# Altium footprint library 3.22-杂项.PcbLib: 985 footprints (part 53 of 64)
Each footprint in its own frame and in the unit in brackets; x right, y up, seen from the top. Pads: shape width x height; smd on the part's side, far side on the other; paste and mask are expansions set on the pad; w line width, h text height; cw(c..) or ccw(c..) is an arc to the next point about the centre after c.
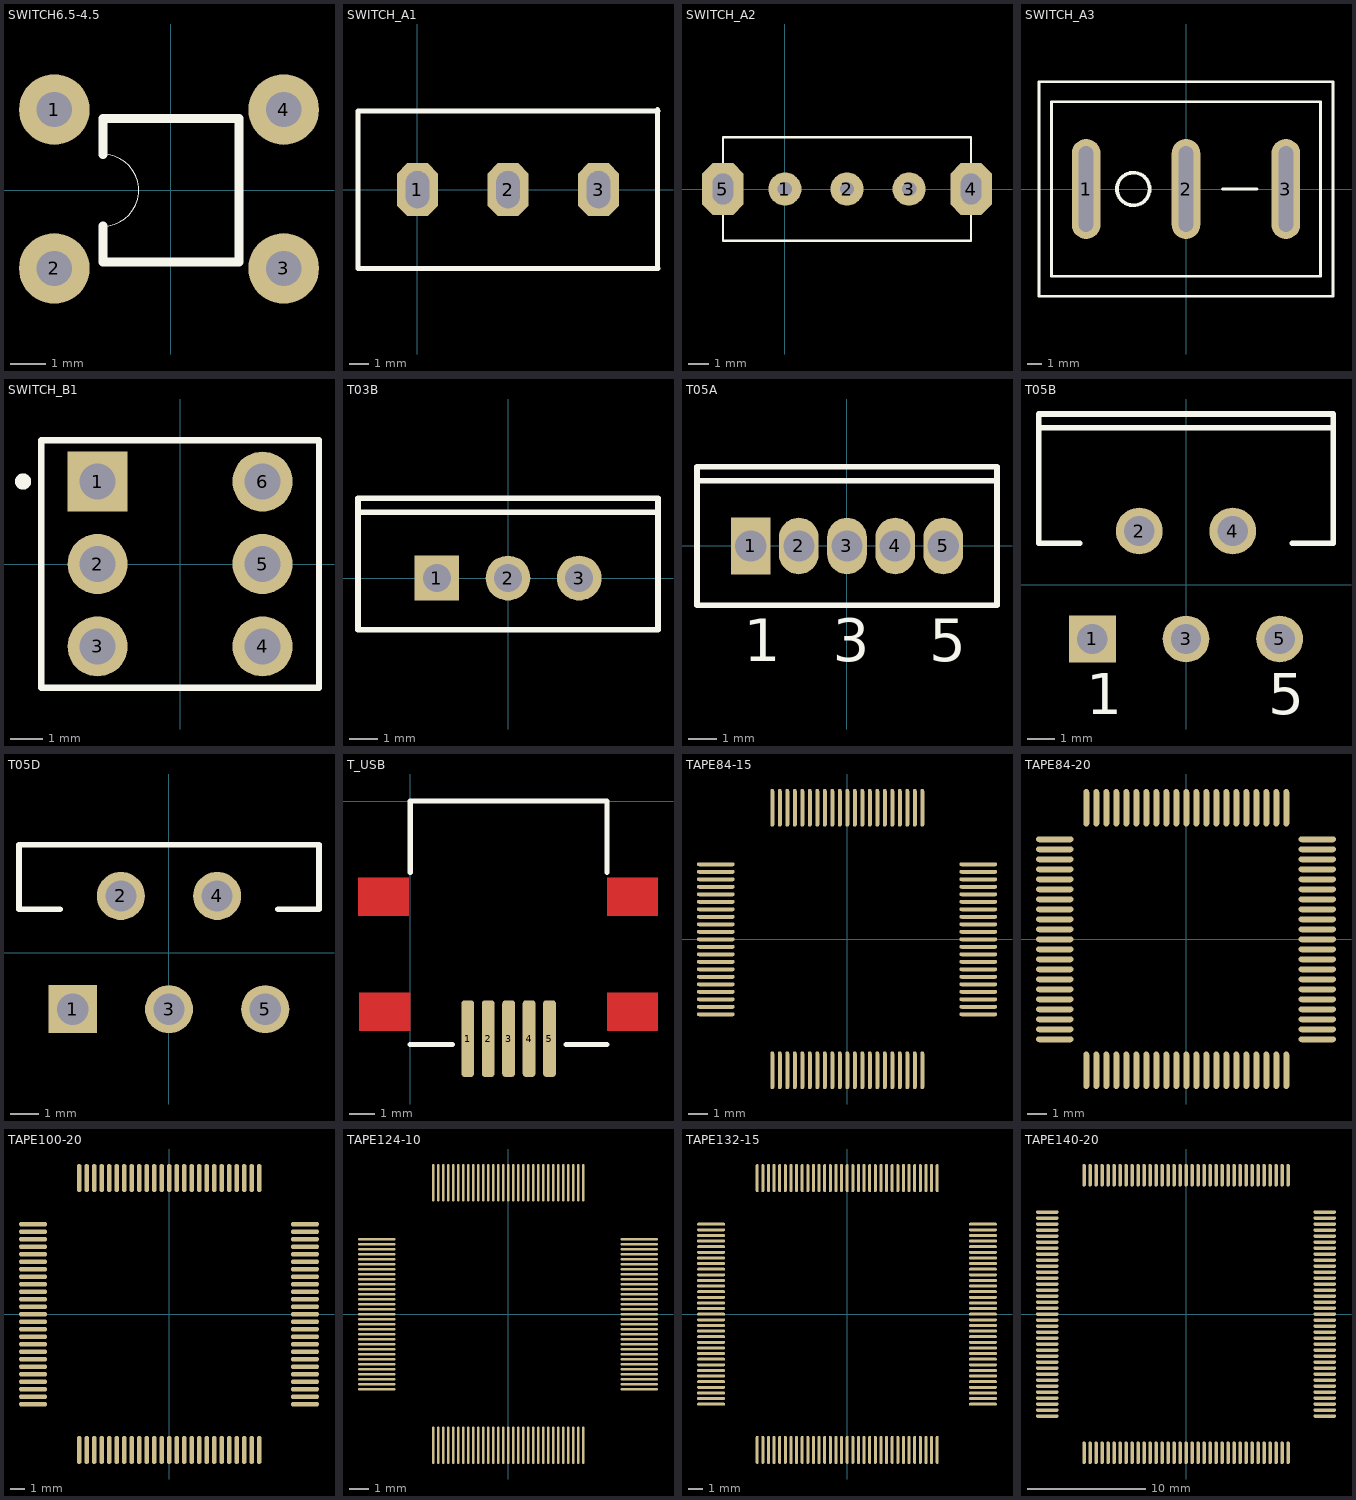
[diagram p52: the footprints below, top view; thin cyan lines are the x and y axes]

## SWITCH6.5-4.5 [mm] "6.5mm*4.5mm"
pads (4):
  round 2 hole 1: 1(-3.302,2.286) 2(-3.302,-2.214) 3(3.198,-2.214) 4(3.198,2.286)
Top Overlay:
  lines w0.025: -1.928,-1.016 ccw(c-1.928,0) -1.928,1.016
  lines w0.254: -1.928,-1.016 -1.928,-2.032 1.928,-2.032 1.928,2.032 -1.928,2.032 -1.928,1.016

## SWITCH_A1 [mm] "扭子开关"
height 10
pads (3):
  oct 2.1x2.7 hole 1.2 slot 1.9 at 90 deg: 1(0,0) 2(4.6,0) 3(9.2,0)
Top Overlay:
  lines w0.254: 12.192,-3.972 12.192,4.064 ; 12.22,-4 -3.02,-4 -3.02,4 12.22,4

## SWITCH_A2 [mm] "平拨开关"
height 9
pads (5):
  round 1.6 hole 0.7: 1(0,0) 2(3,0) 3(6,0)
  oct 2x2.5 hole 1 slot 1.5 at 90 deg: 4(9,0) 5(-3,0)
Top Overlay:
  lines w0.1: -3,-2.5 9,-2.5 9,2.5 -3,2.5 -3,-2.5

## SWITCH_A3 [mm] "单刀单掷开关"
height 9
pads (3):
  oval 2x7 hole 1 slot 6 at 90 deg: 1(-6.985,0) 2(0,0) 3(6.985,0)
Top Overlay:
  circle w0.254: c-3.683,0 r1.143
  lines w0.2: 2.54,0 4.953,0 ; -10.287,-7.493 -10.287,7.493 10.287,7.493 10.287,-7.493 -10.287,-7.493 ; -9.398,-6.096 9.398,-6.096 9.398,6.096 -9.398,6.096 -9.398,-6.096

## SWITCH_B1 [mm] "单刀"
height 1.75
pads (6):
  rect 1.85x1.85 hole 1.1: 1(-2.54,2.54)
  round 1.85 hole 1.1: 2(-2.54,0) 3(-2.54,-2.54) 4(2.54,-2.54) 5(2.54,0) 6(2.54,2.54)
Top Overlay:
  circle w0.25: c-4.836,2.541 r0.125
  lines w0.2: -4.28,-3.81 -4.28,3.81 4.28,3.81 4.28,-3.81 -4.28,-3.81

## T03B [mm] "TO, Thru-Hole, Vertical, Heatsink Mounted; 3 In-Line Leads; Pitch 2.54 mm"
height 19.4
pads (3):
  rect 1.6x1.6 hole 1: 1(-2.54,0)
  round 1.6 hole 1: 2(0,0) 3(2.54,0)
Top Overlay:
  lines w0.2: -5.35,2.35 5.35,2.35 ; -5.35,-1.85 5.35,-1.85 5.35,2.85 -5.35,2.85 -5.35,-1.85

## T05A [mm] "TO, Thru-Hole, Vertical, Heatsink Mounted; 5 In-Line Leads; Pitch 1.70 mm"
height 15.9
pads (5):
  rect 1.4x2 hole 1.1: 1(-3.4,0)
  oval 1.4x2 hole 1.1: 2(-1.7,0) 3(0,0) 4(1.7,0) 5(3.4,0)
Top Overlay:
  lines w0.2: -5.3,2.3 5.3,2.3 ; -5.3,-2.1 5.3,-2.1 5.3,2.8 -5.3,2.8 -5.3,-2.1
  text "1" at -3.65,-4.075 h1.5
  text "3" at -0.5,-4.075 h1.5
  text "5" at 2.9,-4.075 h1.5

## T05B [mm] "TO, Thru-Hole, Vertical, Heatsink Mounted; 5 Bent Staggered Leads; Pitch 1.7 mm"
height 21.1
pads (5):
  rect 1.7x1.7 hole 1.1: 1(-3.4,-1.96)
  round 1.7 hole 1.1: 2(-1.7,1.96) 3(0,-1.96) 4(1.7,1.96) 5(3.4,-1.96)
Top Overlay:
  lines w0.2: -5.35,5.71 5.35,5.71 ; -3.854,1.51 -5.35,1.51 -5.35,6.21 5.35,6.21 5.35,1.51 3.854,1.51
  text "1" at -3.62,-4.685 h1.5
  text "5" at 2.98,-4.685 h1.5

## T05D [mm]
height 21.1
pads (5):
  rect 1.7x1.7 hole 1.1: 1(-3.4,-2)
  round 1.7 hole 1.1: 2(-1.7,2) 3(0,-2) 4(1.7,2) 5(3.4,-2)
Top Overlay:
  lines w0.2: -3.854,1.53 -5.3,1.53 -5.3,3.81 5.3,3.81 5.3,1.53 3.854,1.53

## T_USB [mm]
pads (5):
  rrect50% 0.5x3 smd: 1(2.25,-9.3) 2(3.05,-9.3) 3(3.85,-9.3) 4(4.65,-9.3) 5(5.45,-9.3)
Top Layer:
  rectangle: 7.7,-4.5 9.7,-3
  rectangle: 7.7,-9 9.7,-7.5
  rectangle: -2,-9 0,-7.5
  rectangle: -2.048,-4.5 -0.048,-3
Top Overlay:
  lines w0.2: 0,-9.525 1.651,-9.525 ; 0,-2.794 0,0 7.7,0 7.7,-2.794 ; 6.096,-9.525 7.7,-9.525

## TAPE84-15 [mil]
pads (84):
  oval 75x8 smd: 1(-262.5,149.5) 2(-262.5,134.5) 3(-262.5,119.5) 4(-262.5,104.5) 5(-262.5,89.5) 6(-262.5,74.5) 7(-262.5,59.5) 8(-262.5,44.5) 9(-262.5,29.5) 10(-262.5,14.5) 11(-262.5,-0.5) 12(-262.5,-15.5) 13(-262.5,-30.5) 14(-262.5,-45.5) 15(-262.5,-60.5) 16(-262.5,-75.5) 17(-262.5,-90.5) 18(-262.5,-105.5) 19(-262.5,-120.5) 20(-262.5,-135.5) 21(-262.5,-150.5) 43(262.5,-150.5) 44(262.5,-135.5) 45(262.5,-120.5) 46(262.5,-105.5) 47(262.5,-90.5) 48(262.5,-75.5) 49(262.5,-60.5) 50(262.5,-45.5) 51(262.5,-30.5) 52(262.5,-15.5) 53(262.5,-0.5) 54(262.5,14.5) 55(262.5,29.5) 56(262.5,44.5) 57(262.5,59.5) 58(262.5,74.5) 59(262.5,89.5) 60(262.5,104.5) 61(262.5,119.5) 62(262.5,134.5) 63(262.5,149.5)
  oval 8x75 smd: 22(-149.5,-262.5) 23(-134.5,-262.5) 24(-119.5,-262.5) 25(-104.5,-262.5) 26(-89.5,-262.5) 27(-74.5,-262.5) 28(-59.5,-262.5) 29(-44.5,-262.5) 30(-29.5,-262.5) 31(-14.5,-262.5) 32(0.5,-262.5) 33(15.5,-262.5) 34(30.5,-262.5) 35(45.5,-262.5) 36(60.5,-262.5) 37(75.5,-262.5) 38(90.5,-262.5) 39(105.5,-262.5) 40(120.5,-262.5) 41(135.5,-262.5) 42(150.5,-262.5) 64(150.5,262.5) 65(135.5,262.5) 66(120.5,262.5) 67(105.5,262.5) 68(90.5,262.5) 69(75.5,262.5) 70(60.5,262.5) 71(45.5,262.5) 72(30.5,262.5) 73(15.5,262.5) 74(0.5,262.5) 75(-14.5,262.5) 76(-29.5,262.5) 77(-44.5,262.5) 78(-59.5,262.5) 79(-74.5,262.5) 80(-89.5,262.5) 81(-104.5,262.5) 82(-119.5,262.5) 83(-134.5,262.5) 84(-149.5,262.5)

## TAPE84-20 [mil]
pads (84):
  oval 75x12 smd: 1(-262.5,199.5) 2(-262.5,179.5) 3(-262.5,159.5) 4(-262.5,139.5) 5(-262.5,119.5) 6(-262.5,99.5) 7(-262.5,79.5) 8(-262.5,59.5) 9(-262.5,39.5) 10(-262.5,19.5) 11(-262.5,-0.5) 12(-262.5,-20.5) 13(-262.5,-40.5) 14(-262.5,-60.5) 15(-262.5,-80.5) 16(-262.5,-100.5) 17(-262.5,-120.5) 18(-262.5,-140.5) 19(-262.5,-160.5) 20(-262.5,-180.5) 21(-262.5,-200.5) 43(262.5,-200.5) 44(262.5,-180.5) 45(262.5,-160.5) 46(262.5,-140.5) 47(262.5,-120.5) 48(262.5,-100.5) 49(262.5,-80.5) 50(262.5,-60.5) 51(262.5,-40.5) 52(262.5,-20.5) 53(262.5,-0.5) 54(262.5,19.5) 55(262.5,39.5) 56(262.5,59.5) 57(262.5,79.5) 58(262.5,99.5) 59(262.5,119.5) 60(262.5,139.5) 61(262.5,159.5) 62(262.5,179.5) 63(262.5,199.5)
  oval 12x75 smd: 22(-199.5,-262.5) 23(-179.5,-262.5) 24(-159.5,-262.5) 25(-139.5,-262.5) 26(-119.5,-262.5) 27(-99.5,-262.5) 28(-79.5,-262.5) 29(-59.5,-262.5) 30(-39.5,-262.5) 31(-19.5,-262.5) 32(0.5,-262.5) 33(20.5,-262.5) 34(40.5,-262.5) 35(60.5,-262.5) 36(80.5,-262.5) 37(100.5,-262.5) 38(120.5,-262.5) 39(140.5,-262.5) 40(160.5,-262.5) 41(180.5,-262.5) 42(200.5,-262.5) 64(200.5,262.5) 65(180.5,262.5) 66(160.5,262.5) 67(140.5,262.5) 68(120.5,262.5) 69(100.5,262.5) 70(80.5,262.5) 71(60.5,262.5) 72(40.5,262.5) 73(20.5,262.5) 74(0.5,262.5) 75(-19.5,262.5) 76(-39.5,262.5) 77(-59.5,262.5) 78(-79.5,262.5) 79(-99.5,262.5) 80(-119.5,262.5) 81(-139.5,262.5) 82(-159.5,262.5) 83(-179.5,262.5) 84(-199.5,262.5)

## TAPE100-20 [mil]
pads (100):
  oval 75x12 smd: 1(-362.5,239.5) 2(-362.5,219.5) 3(-362.5,199.5) 4(-362.5,179.5) 5(-362.5,159.5) 6(-362.5,139.5) 7(-362.5,119.5) 8(-362.5,99.5) 9(-362.5,79.5) 10(-362.5,59.5) 11(-362.5,39.5) 12(-362.5,19.5) 13(-362.5,-0.5) 14(-362.5,-20.5) 15(-362.5,-40.5) 16(-362.5,-60.5) 17(-362.5,-80.5) 18(-362.5,-100.5) 19(-362.5,-120.5) 20(-362.5,-140.5) 21(-362.5,-160.5) 22(-362.5,-180.5) 23(-362.5,-200.5) 24(-362.5,-220.5) 25(-362.5,-240.5) 51(362.5,-240.5) 52(362.5,-220.5) 53(362.5,-200.5) 54(362.5,-180.5) 55(362.5,-160.5) 56(362.5,-140.5) 57(362.5,-120.5) 58(362.5,-100.5) 59(362.5,-80.5) 60(362.5,-60.5) 61(362.5,-40.5) 62(362.5,-20.5) 63(362.5,-0.5) 64(362.5,19.5) 65(362.5,39.5) 66(362.5,59.5) 67(362.5,79.5) 68(362.5,99.5) 69(362.5,119.5) 70(362.5,139.5) 71(362.5,159.5) 72(362.5,179.5) 73(362.5,199.5) 74(362.5,219.5) 75(362.5,239.5)
  oval 12x75 smd: 26(-239.5,-362.5) 27(-219.5,-362.5) 28(-199.5,-362.5) 29(-179.5,-362.5) 30(-159.5,-362.5) 31(-139.5,-362.5) 32(-119.5,-362.5) 33(-99.5,-362.5) 34(-79.5,-362.5) 35(-59.5,-362.5) 36(-39.5,-362.5) 37(-19.5,-362.5) 38(0.5,-362.5) 39(20.5,-362.5) 40(40.5,-362.5) 41(60.5,-362.5) 42(80.5,-362.5) 43(100.5,-362.5) 44(120.5,-362.5) 45(140.5,-362.5) 46(160.5,-362.5) 47(180.5,-362.5) 48(200.5,-362.5) 49(220.5,-362.5) 50(240.5,-362.5) 76(240.5,362.5) 77(220.5,362.5) 78(200.5,362.5) 79(180.5,362.5) 80(160.5,362.5) 81(140.5,362.5) 82(120.5,362.5) 83(100.5,362.5) 84(80.5,362.5) 85(60.5,362.5) 86(40.5,362.5) 87(20.5,362.5) 88(0.5,362.5) 89(-19.5,362.5) 90(-39.5,362.5) 91(-59.5,362.5) 92(-79.5,362.5) 93(-99.5,362.5) 94(-119.5,362.5) 95(-139.5,362.5) 96(-159.5,362.5) 97(-179.5,362.5) 98(-199.5,362.5) 99(-219.5,362.5) 100(-239.5,362.5)

## TAPE124-10 [mil]
pads (124):
  oval 75x5 smd: 1(-262.5,149.5) 2(-262.5,139.5) 3(-262.5,129.5) 4(-262.5,119.5) 5(-262.5,109.5) 6(-262.5,99.5) 7(-262.5,89.5) 8(-262.5,79.5) 9(-262.5,69.5) 10(-262.5,59.5) 11(-262.5,49.5) 12(-262.5,39.5) 13(-262.5,29.5) 14(-262.5,19.5) 15(-262.5,9.5) 16(-262.5,-0.5) 17(-262.5,-10.5) 18(-262.5,-20.5) 19(-262.5,-30.5) 20(-262.5,-40.5) 21(-262.5,-50.5) 22(-262.5,-60.5) 23(-262.5,-70.5) 24(-262.5,-80.5) 25(-262.5,-90.5) 26(-262.5,-100.5) 27(-262.5,-110.5) 28(-262.5,-120.5) 29(-262.5,-130.5) 30(-262.5,-140.5) 31(-262.5,-150.5) 63(262.5,-150.5) 64(262.5,-140.5) 65(262.5,-130.5) 66(262.5,-120.5) 67(262.5,-110.5) 68(262.5,-100.5) 69(262.5,-90.5) 70(262.5,-80.5) 71(262.5,-70.5) 72(262.5,-60.5) 73(262.5,-50.5) 74(262.5,-40.5) 75(262.5,-30.5) 76(262.5,-20.5) 77(262.5,-10.5) 78(262.5,-0.5) 79(262.5,9.5) 80(262.5,19.5) 81(262.5,29.5) 82(262.5,39.5) 83(262.5,49.5) 84(262.5,59.5) 85(262.5,69.5) 86(262.5,79.5) 87(262.5,89.5) 88(262.5,99.5) 89(262.5,109.5) 90(262.5,119.5) 91(262.5,129.5) 92(262.5,139.5) 93(262.5,149.5)
  oval 5x75 smd: 32(-149.5,-262.5) 33(-139.5,-262.5) 34(-129.5,-262.5) 35(-119.5,-262.5) 36(-109.5,-262.5) 37(-99.5,-262.5) 38(-89.5,-262.5) 39(-79.5,-262.5) 40(-69.5,-262.5) 41(-59.5,-262.5) 42(-49.5,-262.5) 43(-39.5,-262.5) 44(-29.5,-262.5) 45(-19.5,-262.5) 46(-9.5,-262.5) 47(0.5,-262.5) 48(10.5,-262.5) 49(20.5,-262.5) 50(30.5,-262.5) 51(40.5,-262.5) 52(50.5,-262.5) 53(60.5,-262.5) 54(70.5,-262.5) 55(80.5,-262.5) 56(90.5,-262.5) 57(100.5,-262.5) 58(110.5,-262.5) 59(120.5,-262.5) 60(130.5,-262.5) 61(140.5,-262.5) 62(150.5,-262.5) 94(150.5,262.5) 95(140.5,262.5) 96(130.5,262.5) 97(120.5,262.5) 98(110.5,262.5) 99(100.5,262.5) 100(90.5,262.5) 101(80.5,262.5) 102(70.5,262.5) 103(60.5,262.5) 104(50.5,262.5) 105(40.5,262.5) 106(30.5,262.5) 107(20.5,262.5) 108(10.5,262.5) 109(0.5,262.5) 110(-9.5,262.5) 111(-19.5,262.5) 112(-29.5,262.5) 113(-39.5,262.5) 114(-49.5,262.5) 115(-59.5,262.5) 116(-69.5,262.5) 117(-79.5,262.5) 118(-89.5,262.5) 119(-99.5,262.5) 120(-109.5,262.5) 121(-119.5,262.5) 122(-129.5,262.5) 123(-139.5,262.5) 124(-149.5,262.5)

## TAPE132-15 [mil]
pads (132):
  oval 75x8 smd: 1(-362.5,239.5) 2(-362.5,224.5) 3(-362.5,209.5) 4(-362.5,194.5) 5(-362.5,179.5) 6(-362.5,164.5) 7(-362.5,149.5) 8(-362.5,134.5) 9(-362.5,119.5) 10(-362.5,104.5) 11(-362.5,89.5) 12(-362.5,74.5) 13(-362.5,59.5) 14(-362.5,44.5) 15(-362.5,29.5) 16(-362.5,14.5) 17(-362.5,-0.5) 18(-362.5,-15.5) 19(-362.5,-30.5) 20(-362.5,-45.5) 21(-362.5,-60.5) 22(-362.5,-75.5) 23(-362.5,-90.5) 24(-362.5,-105.5) 25(-362.5,-120.5) 26(-362.5,-135.5) 27(-362.5,-150.5) 28(-362.5,-165.5) 29(-362.5,-180.5) 30(-362.5,-195.5) 31(-362.5,-210.5) 32(-362.5,-225.5) 33(-362.5,-240.5) 67(362.5,-240.5) 68(362.5,-225.5) 69(362.5,-210.5) 70(362.5,-195.5) 71(362.5,-180.5) 72(362.5,-165.5) 73(362.5,-150.5) 74(362.5,-135.5) 75(362.5,-120.5) 76(362.5,-105.5) 77(362.5,-90.5) 78(362.5,-75.5) 79(362.5,-60.5) 80(362.5,-45.5) 81(362.5,-30.5) 82(362.5,-15.5) 83(362.5,-0.5) 84(362.5,14.5) 85(362.5,29.5) 86(362.5,44.5) 87(362.5,59.5) 88(362.5,74.5) 89(362.5,89.5) 90(362.5,104.5) 91(362.5,119.5) 92(362.5,134.5) 93(362.5,149.5) 94(362.5,164.5) 95(362.5,179.5) 96(362.5,194.5) 97(362.5,209.5) 98(362.5,224.5) 99(362.5,239.5)
  oval 8x75 smd: 34(-239.5,-362.5) 35(-224.5,-362.5) 36(-209.5,-362.5) 37(-194.5,-362.5) 38(-179.5,-362.5) 39(-164.5,-362.5) 40(-149.5,-362.5) 41(-134.5,-362.5) 42(-119.5,-362.5) 43(-104.5,-362.5) 44(-89.5,-362.5) 45(-74.5,-362.5) 46(-59.5,-362.5) 47(-44.5,-362.5) 48(-29.5,-362.5) 49(-14.5,-362.5) 50(0.5,-362.5) 51(15.5,-362.5) 52(30.5,-362.5) 53(45.5,-362.5) 54(60.5,-362.5) 55(75.5,-362.5) 56(90.5,-362.5) 57(105.5,-362.5) 58(120.5,-362.5) 59(135.5,-362.5) 60(150.5,-362.5) 61(165.5,-362.5) 62(180.5,-362.5) 63(195.5,-362.5) 64(210.5,-362.5) 65(225.5,-362.5) 66(240.5,-362.5) 100(240.5,362.5) 101(225.5,362.5) 102(210.5,362.5) 103(195.5,362.5) 104(180.5,362.5) 105(165.5,362.5) 106(150.5,362.5) 107(135.5,362.5) 108(120.5,362.5) 109(105.5,362.5) 110(90.5,362.5) 111(75.5,362.5) 112(60.5,362.5) 113(45.5,362.5) 114(30.5,362.5) 115(15.5,362.5) 116(0.5,362.5) 117(-14.5,362.5) 118(-29.5,362.5) 119(-44.5,362.5) 120(-59.5,362.5) 121(-74.5,362.5) 122(-89.5,362.5) 123(-104.5,362.5) 124(-119.5,362.5) 125(-134.5,362.5) 126(-149.5,362.5) 127(-164.5,362.5) 128(-179.5,362.5) 129(-194.5,362.5) 130(-209.5,362.5) 131(-224.5,362.5) 132(-239.5,362.5)

## TAPE140-20 [mil]
pads (140):
  oval 75x12 smd: 1(-462.5,339.5) 2(-462.5,319.5) 3(-462.5,299.5) 4(-462.5,279.5) 5(-462.5,259.5) 6(-462.5,239.5) 7(-462.5,219.5) 8(-462.5,199.5) 9(-462.5,179.5) 10(-462.5,159.5) 11(-462.5,139.5) 12(-462.5,119.5) 13(-462.5,99.5) 14(-462.5,79.5) 15(-462.5,59.5) 16(-462.5,39.5) 17(-462.5,19.5) 18(-462.5,-0.5) 19(-462.5,-20.5) 20(-462.5,-40.5) 21(-462.5,-60.5) 22(-462.5,-80.5) 23(-462.5,-100.5) 24(-462.5,-120.5) 25(-462.5,-140.5) 26(-462.5,-160.5) 27(-462.5,-180.5) 28(-462.5,-200.5) 29(-462.5,-220.5) 30(-462.5,-240.5) 31(-462.5,-260.5) 32(-462.5,-280.5) 33(-462.5,-300.5) 34(-462.5,-320.5) 35(-462.5,-340.5) 71(462.5,-340.5) 72(462.5,-320.5) 73(462.5,-300.5) 74(462.5,-280.5) 75(462.5,-260.5) 76(462.5,-240.5) 77(462.5,-220.5) 78(462.5,-200.5) 79(462.5,-180.5) 80(462.5,-160.5) 81(462.5,-140.5) 82(462.5,-120.5) 83(462.5,-100.5) 84(462.5,-80.5) 85(462.5,-60.5) 86(462.5,-40.5) 87(462.5,-20.5) 88(462.5,-0.5) 89(462.5,19.5) 90(462.5,39.5) 91(462.5,59.5) 92(462.5,79.5) 93(462.5,99.5) 94(462.5,119.5) 95(462.5,139.5) 96(462.5,159.5) 97(462.5,179.5) 98(462.5,199.5) 99(462.5,219.5) 100(462.5,239.5) 101(462.5,259.5) 102(462.5,279.5) 103(462.5,299.5) 104(462.5,319.5) 105(462.5,339.5)
  oval 12x75 smd: 36(-339.5,-462.5) 37(-319.5,-462.5) 38(-299.5,-462.5) 39(-279.5,-462.5) 40(-259.5,-462.5) 41(-239.5,-462.5) 42(-219.5,-462.5) 43(-199.5,-462.5) 44(-179.5,-462.5) 45(-159.5,-462.5) 46(-139.5,-462.5) 47(-119.5,-462.5) 48(-99.5,-462.5) 49(-79.5,-462.5) 50(-59.5,-462.5) 51(-39.5,-462.5) 52(-19.5,-462.5) 53(0.5,-462.5) 54(20.5,-462.5) 55(40.5,-462.5) 56(60.5,-462.5) 57(80.5,-462.5) 58(100.5,-462.5) 59(120.5,-462.5) 60(140.5,-462.5) 61(160.5,-462.5) 62(180.5,-462.5) 63(200.5,-462.5) 64(220.5,-462.5) 65(240.5,-462.5) 66(260.5,-462.5) 67(280.5,-462.5) 68(300.5,-462.5) 69(320.5,-462.5) 70(340.5,-462.5) 106(340.5,462.5) 107(320.5,462.5) 108(300.5,462.5) 109(280.5,462.5) 110(260.5,462.5) 111(240.5,462.5) 112(220.5,462.5) 113(200.5,462.5) 114(180.5,462.5) 115(160.5,462.5) 116(140.5,462.5) 117(120.5,462.5) 118(100.5,462.5) 119(80.5,462.5) 120(60.5,462.5) 121(40.5,462.5) 122(20.5,462.5) 123(0.5,462.5) 124(-19.5,462.5) 125(-39.5,462.5) 126(-59.5,462.5) 127(-79.5,462.5) 128(-99.5,462.5) 129(-119.5,462.5) 130(-139.5,462.5) 131(-159.5,462.5) 132(-179.5,462.5) 133(-199.5,462.5) 134(-219.5,462.5) 135(-239.5,462.5) 136(-259.5,462.5) 137(-279.5,462.5) 138(-299.5,462.5) 139(-319.5,462.5) 140(-339.5,462.5)